# Altium footprint library PcbLib1.PcbLib: 157 footprints (part 7 of 10)
Each footprint in its own frame and in the unit in brackets; x right, y up, seen from the top. Pads: shape width x height; smd on the part's side, far side on the other; paste and mask are expansions set on the pad; w line width, h text height; cw(c..) or ccw(c..) is an arc to the next point about the centre after c.
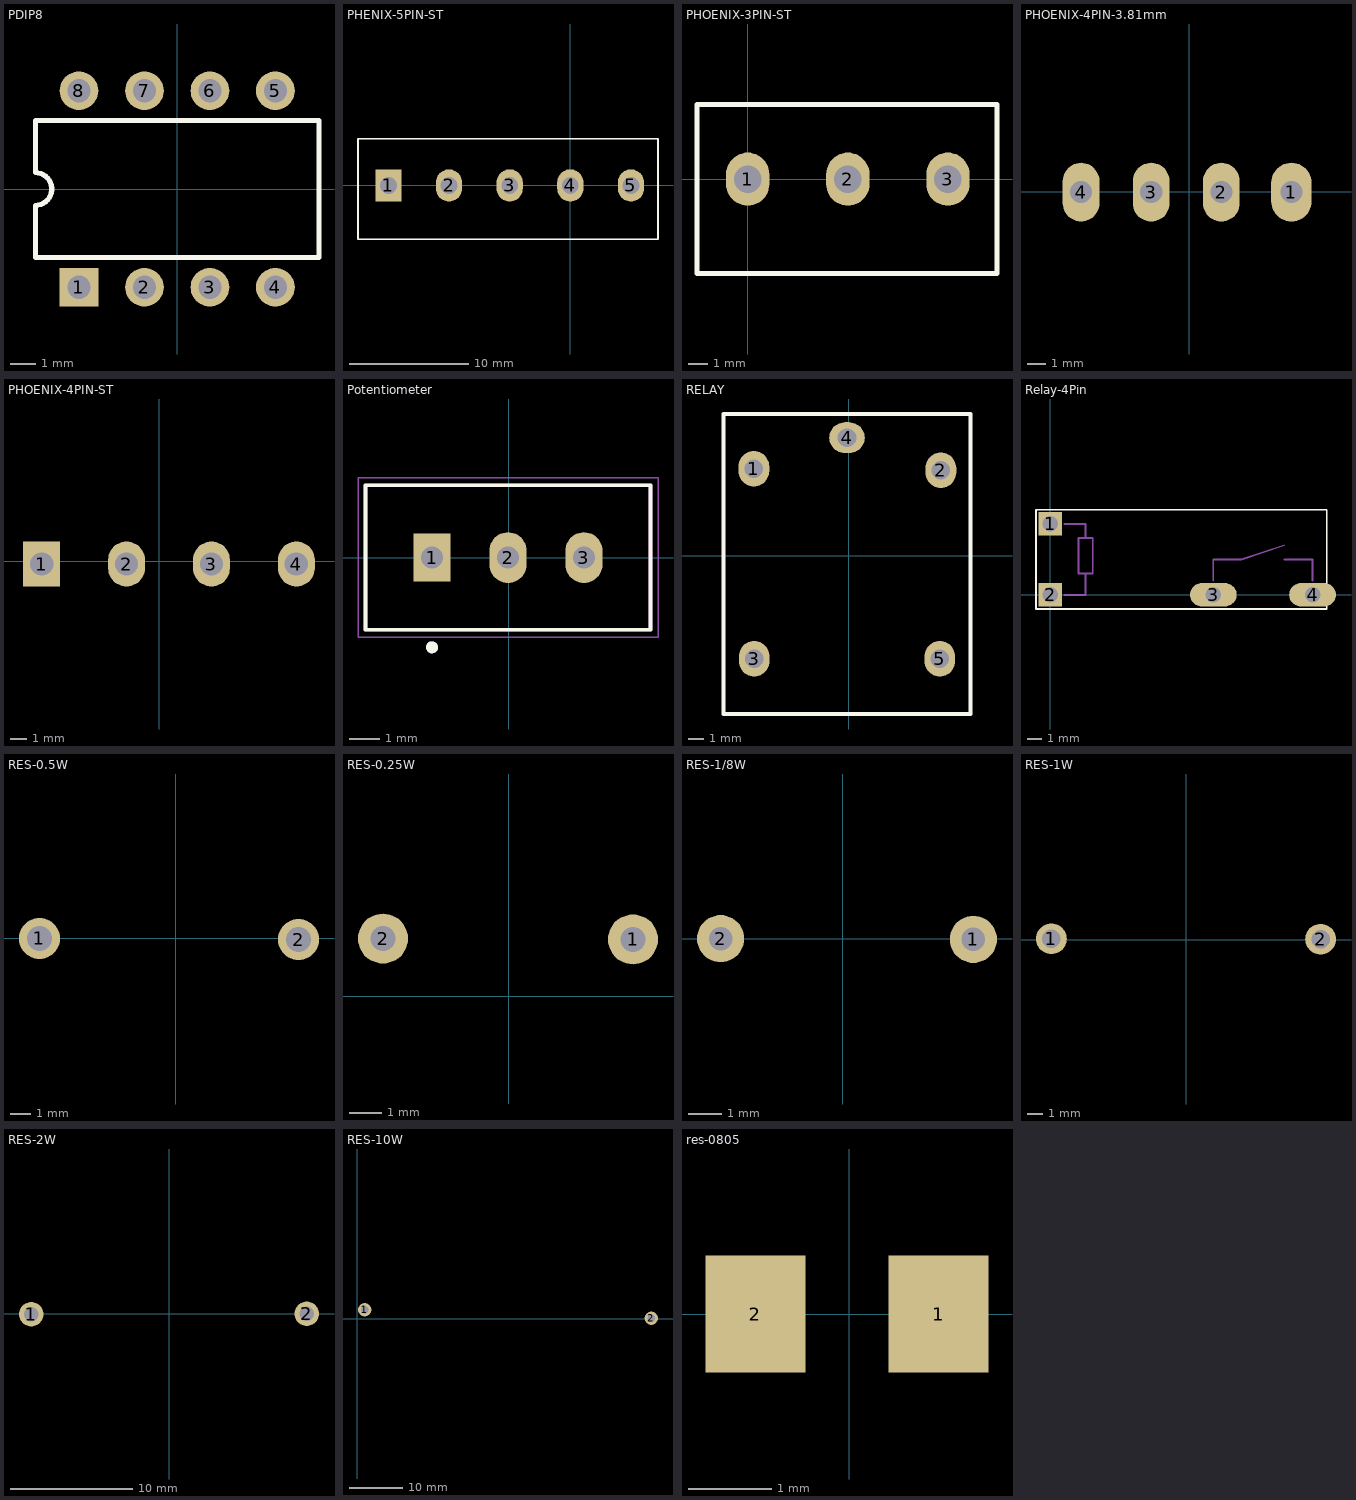
[diagram p6: the footprints below, top view; thin cyan lines are the x and y axes]

## PCBComponent_1 [mm]

## PDIP8 [mm] "DIP; 8 Leads; Row Spacing 7.62 mm; Pitch 2.54 mm"
height 5.33
pads (8):
  rect 1.5x1.5 hole 0.9: 1(-3.81,-3.81)
  round 1.5 hole 0.9: 2(-1.27,-3.81) 3(1.27,-3.81) 4(3.81,-3.81) 5(3.81,3.81) 6(1.27,3.81) 7(-1.27,3.81) 8(-3.81,3.81)
Top Overlay:
  lines w0.2: -5.5,-2.65 5.5,-2.65 5.5,2.65 -5.5,2.65 -5.5,0.635 cw(c-5.5,0) -5.5,-0.635 -5.5,-2.65
3D body "User Library-PDIP-8.STEP": height 5.1, standoff -3.18, extent -5,-4.13 5,4.13

## PHENIX-5PIN-ST [mm]
pads (5):
  rect 2.2x2.7 hole 1.4: 1(-15.24,0)
  oval 2.2x2.7 hole 1.4: 2(-10.16,0) 3(-5.08,0) 4(0,0) 5(5.08,0)
Top Overlay:
  lines w0.127: -17.79,-4.5 7.35,-4.5 7.35,3.9 -17.79,3.9 -17.79,-4.5

## PHOENIX-3PIN-ST [mm]
pads (3):
  oval 2.2x2.7 hole 1.4: 1(0,0) 2(5.08,0) 3(10.16,0)
Top Overlay:
  lines w0.254: -2.575,-4.8 12.65,-4.8 12.65,3.8 -2.575,3.8 -2.575,-4.8
3D body "1758021.stp": height 12, standoff -3.9, extent -2.57,-4.8 12.67,3.8

## PHOENIX-4PIN-3.81mm [mm]
pads (4):
  oval 2.2x3.2 hole 1.2: 1(5.55,-0.025)
  oval 2x3.2 hole 1.2: 2(1.74,-0.025) 3(-2.07,-0.025) 4(-5.88,-0.025)
Bottom Overlay:
  lines w0.254: -8.33,-2.355 7.97,-2.355 7.97,2.645 -8.33,2.645 -8.33,-2.355

## PHOENIX-4PIN-ST [mm]
pads (4):
  rect 2.2x2.7 hole 1.4: 1(-7.05,-0.15)
  oval 2.2x2.7 hole 1.4: 2(-1.97,-0.15) 3(3.11,-0.15) 4(8.19,-0.15)
3D body "282825-4--3DModel-STEP-1.STEP": height 12.3, standoff -3.7, extent -9.57,-4.65 10.75,3.7

## Potentiometer [mm]
pads (3):
  rect 1.248x1.6 hole 0.74: 1(-2.559,0.004)
  oval 1.248x1.7 hole 0.74: 2(-0.019,0.004) 3(2.521,0.004)
Top Overlay:
  circle w0.2: c-2.559,-2.996 r0.1
  lines w0.127: -4.784,-2.406 4.746,-2.406 4.746,2.424 -4.784,2.424 -4.784,-2.406
Mechanical 13:
  circle w0.2: c-2.559,-2.996 r0.1
  lines w0.127: -4.784,-2.406 -4.784,2.424 4.746,2.424 4.746,-2.406 -4.784,-2.406
Mechanical 15:
  lines w0.05: -5.034,-2.656 4.996,-2.656 4.996,2.674 -5.034,2.674 -5.034,-2.656
3D body "User Library-Trimmer Potentiometers(3296W-1-102LF).STEP": height 11.17, standoff -8, extent -4.74,-2.475 4.79,2.355

## RELAY [mm]
pads (5):
  oval 2x2.3 hole 1.2: 1(-6.131,5.636) 2(5.959,5.534) 3(-6.106,-6.658) 5(5.894,-6.658)
  oval 2.3x2 hole 1.2: 4(-0.106,7.642)
Top Overlay:
  lines w0.254: -8.106,-10.225 7.894,-10.225 7.894,9.175 -8.106,9.175 -8.106,-10.225
3D body "User Library-RELE.STEP": height 15, standoff -3, extent -8.075,-10.275 7.825,9.225

## Relay-4Pin [mm]
pads (4):
  rect 1.65x1.65 hole 1.1: 1(0,5) 2(0,0)
  oval 3.3x1.65 hole 1.1: 3(11.5,0) 4(18.5,0)
Top Overlay:
  lines w0.127: -1,-1 -1,6 19.5,6 19.5,-1 -1,-1
Mechanical 13:
  lines w0.127: 1,0 2.5,0 2.5,1.5 ; 1,5 2.5,5 2.5,4 ; 11.5,1 11.5,2.5 13.5,2.5 16.5,3.5 ; 16.5,2.5 18.5,2.5 18.5,1 ; 2.5,1.5 3,1.5 3,4 2.5,4 ; 2.5,1.5 2,1.5 2,4 2.5,4
3D body "User Library-SRBRlySimple.STEP": height 15.2, standoff -2.9, extent -1,-1.125 19.5,5.875

## RES-0.5W [mm]
pads (2):
  round 2 hole 1.2: 1(-6.655,0) 2(5.994,-0.051)
3D body "User Library-Res50-Axial 0_5W-22R.STEP": height 8.37, standoff -1, extent -7.055,-1.875 6.395,1.875

## RES-0.25W [mil]
pads (2):
  round 60 hole 30: 1(149,68) 2(-151,69)
3D body "User Library-R-Axial-0_25W-7_62.STEP": height 204.83, standoff -39.37, extent -163,20.65 160.62,115.35

## RES-1/8W [mm]
pads (2):
  round 1.4 hole 0.7: 1(3.886,-0.025) 2(-3.632,0)
3D body "User Library-1_8w_dip.STEP": height 1.9, standoff -4, extent -3.822,-0.914 4.178,0.886

## RES-1W [mm]
pads (2):
  round 2 hole 1.2: 1(-8.738,0.076) 2(8.712,0.051)
3D body "User Library-RES1_0L17_5.STEP": height 7.1, standoff -2.5, extent -9.1,-3.249 9.1,3.351

## RES-2W [mm]
pads (2):
  round 2 hole 1.2: 1(-11.278,-0.025) 2(11.278,0)
3D body "User Library-RES2_0L22_5_china.STEP": height 7.5, standoff -0.5, extent -11.65,-2.5 11.65,2.5

## RES-10W [mm]
pads (2):
  round 2.5 hole 1.4: 1(1.375,1.675) 2(55.15,0.075)
3D body "User Library-SQP-10W.STEP": height 9, standoff -2.5, extent -0.35,-4.85 58.35,5.15

## res-0805 [mm]
pads (2):
  rect 1.2x1.4 smd: 1(1.075,0) 2(-1.125,0)
3D body "User Library-RESC2012X___.STEP": height 0.7, standoff 0, extent -1,-0.6 1,0.6